# Altium footprint library 1.01-电阻.PcbLib: 82 footprints (part 2 of 6)
Each footprint in its own frame and in the unit in brackets; x right, y up, seen from the top. Pads: shape width x height; smd on the part's side, far side on the other; paste and mask are expansions set on the pad; w line width, h text height; cw(c..) or ccw(c..) is an arc to the next point about the centre after c.
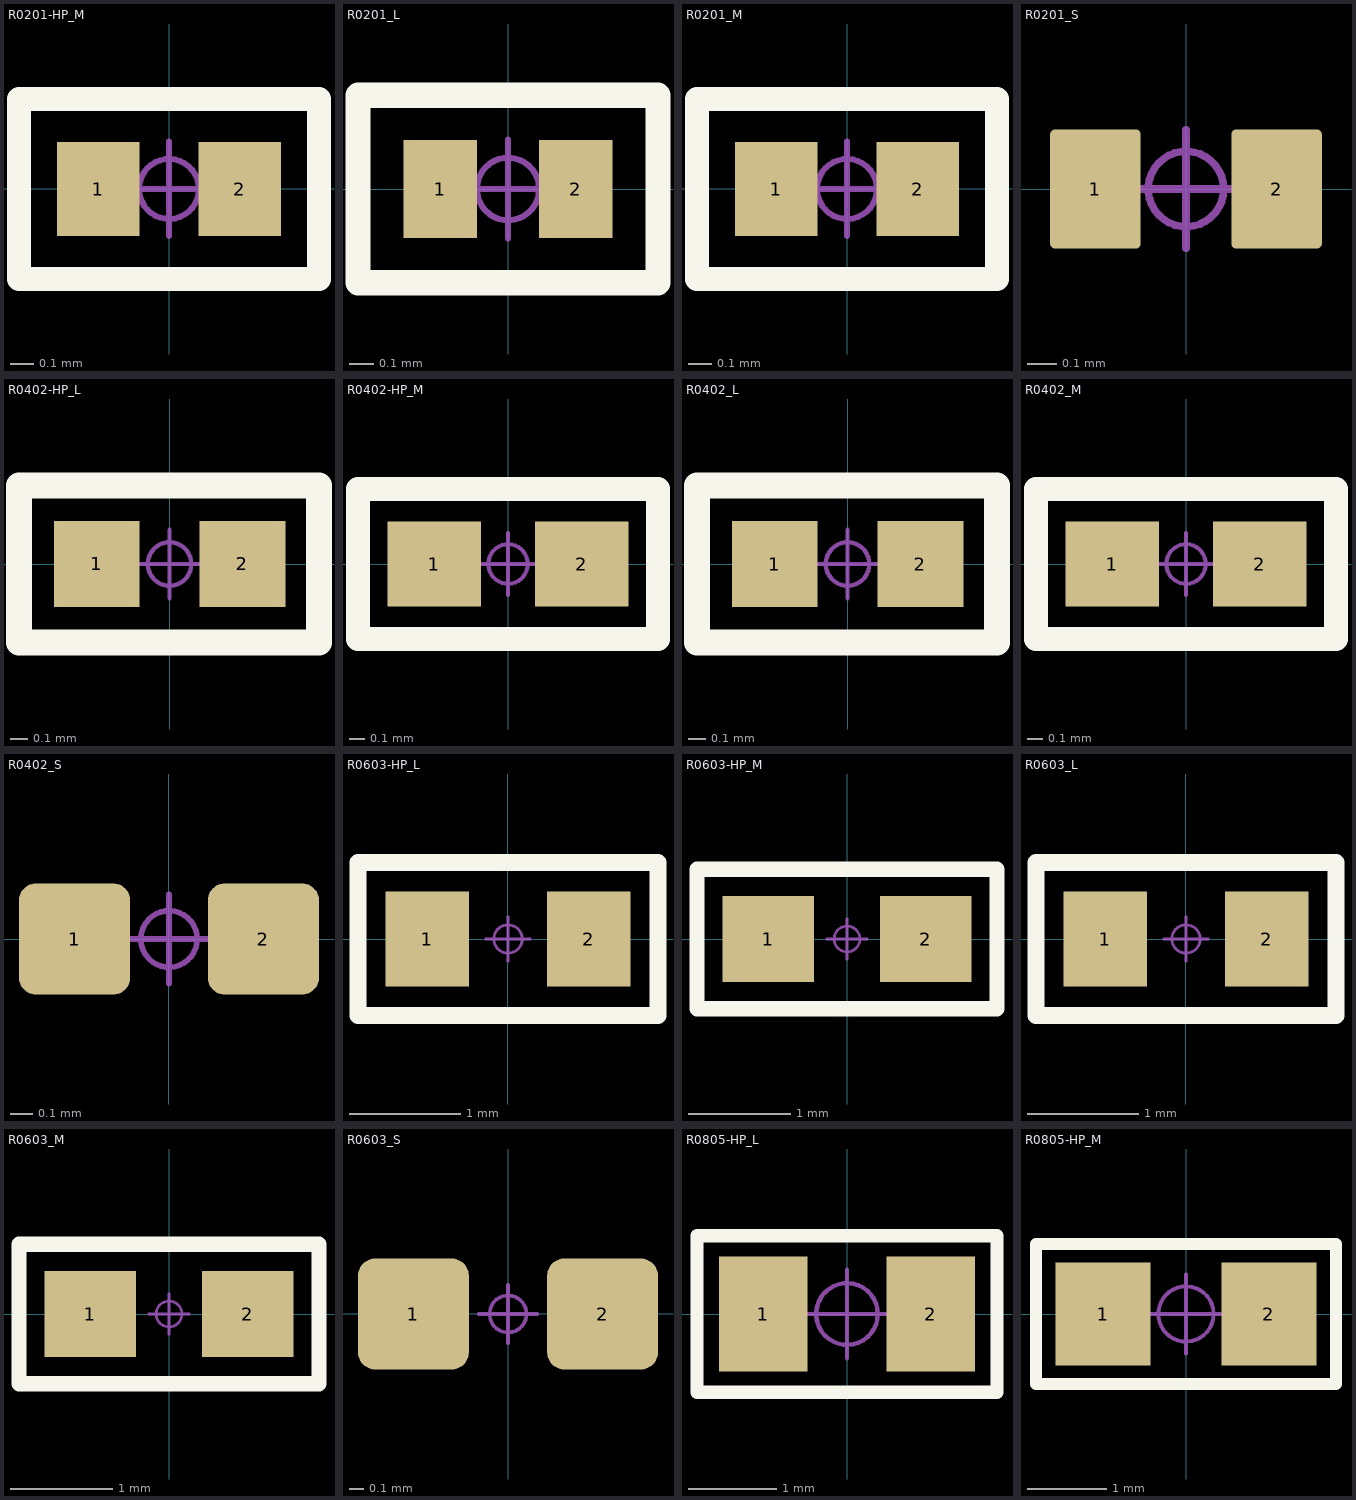
[diagram p1: the footprints below, top view; thin cyan lines are the x and y axes]

## R0201-HP_M [mm] "1/20W高精度贴片电阻           联系卖家 免费查找封装"
pads (2):
  rect 0.35x0.4 smd: 1(-0.3,0) 2(0.3,0)
Top Overlay:
  lines w0.102: -0.635,-0.381 -0.635,0.381 0.635,0.381 0.635,-0.381 -0.635,-0.381
Mechanical 15:
  circle w0.025: c0,0 r0.127
  lines w0.025: -0.2,0 0.2,0 ; 0,-0.2 0,0.2
3D body: height 0.23, standoff 0, extent -0.3,-0.15 0.3,0.15

## R0201_L [mm] "1/20W贴片电阻"
pads (2):
  rect 0.3x0.4 smd: 1(-0.275,0) 2(0.275,0)
Top Overlay:
  lines w0.102: -0.61,-0.381 -0.61,0.381 0.61,0.381 0.61,-0.381 -0.61,-0.381
Mechanical 15:
  circle w0.025: c0,0 r0.127
  lines w0.025: -0.2,0 0.2,0 ; 0,-0.2 0,0.2
3D body: height 0.23, standoff 0, extent -0.3,-0.15 0.3,0.15

## R0201_M [mm] "1/20W贴片电阻"
pads (2):
  rect 0.35x0.4 smd: 1(-0.3,0) 2(0.3,0)
Top Overlay:
  lines w0.102: 0.178,-0.381 0.61,-0.381 ; -0.635,-0.381 0.635,-0.381 0.635,0.381 -0.635,0.381 -0.635,-0.381
Mechanical 15:
  circle w0.025: c0,0 r0.127
  lines w0.025: -0.2,0 0.2,0 ; 0,-0.2 0,0.2
3D body: height 0.23, standoff 0, extent -0.3,-0.15 0.3,0.15

## R0201_S [mil] "1/20W贴片电阻-无丝印"
height 68.9
pads (2):
  rrect10% 12x15.75 smd mask+2: 1(-12,0) 2(12,0)
Mechanical 15:
  circle w1: c0,0 r5
  lines w1: -7.87,0 7.87,0 ; 0,-7.87 0,7.87
3D body: height 9.06, standoff 0, extent -11.81,-5.9 11.81,5.91

## R0402-HP_L [mm] "1/16W高精度贴片电阻"
pads (2):
  rect 0.5x0.5 smd: 1(-0.425,0) 2(0.425,0)
Top Overlay:
  lines w0.152: -0.878,-0.457 -0.878,0.457 0.872,0.457 0.872,-0.457 -0.878,-0.457
Mechanical 15:
  circle w0.025: c0,0 r0.127
  lines w0.025: -0.2,0 0.2,0 ; 0,-0.2 0,0.2
3D body: height 0.3, standoff 0, extent -0.5,-0.25 0.5,0.25

## R0402-HP_M [mm] "1/16W高精度贴片电阻"
pads (2):
  rect 0.6x0.55 smd: 1(-0.475,0) 2(0.475,0)
Top Overlay:
  lines w0.152: -0.965,-0.483 -0.965,0.483 0.965,0.483 0.965,-0.483 -0.965,-0.483
Mechanical 15:
  circle w0.025: c0,0 r0.127
  lines w0.025: -0.2,0 0.2,0 ; 0,-0.2 0,0.2
3D body: height 0.3, standoff 0, extent -0.5,-0.25 0.5,0.25

## R0402_L [mm] "1/16W贴片电阻"
pads (2):
  rect 0.5x0.5 smd: 1(-0.425,0) 2(0.425,0)
Top Overlay:
  lines w0.152: -0.878,-0.457 0.872,-0.457 0.872,0.457 -0.878,0.457 -0.878,-0.457
Mechanical 15:
  circle w0.025: c0,0 r0.127
  lines w0.025: -0.2,0 0.2,0 ; 0,-0.2 0,0.2
3D body: height 0.3, standoff 0, extent -0.5,-0.25 0.5,0.25

## R0402_M [mm] "1/16W贴片电阻"
pads (2):
  rect 0.6x0.55 smd: 1(-0.475,0) 2(0.475,0)
Top Overlay:
  lines w0.152: -0.965,-0.483 0.965,-0.483 0.965,0.483 -0.965,0.483 -0.965,-0.483
Mechanical 15:
  circle w0.025: c0,0 r0.127
  lines w0.025: -0.2,0 0.2,0 ; 0,-0.2 0,0.2
3D body: height 0.3, standoff 0, extent -0.5,-0.25 0.5,0.25

## R0402_S [mm] "1/16W贴片电阻-无丝印"
height 1.75
pads (2):
  rrect30% 0.5x0.5 smd mask+0.051: 1(-0.425,0) 2(0.425,0)
Mechanical 15:
  circle w0.025: c0,0 r0.127
  lines w0.025: -0.2,0 0.2,0 ; 0,-0.2 0,0.2
3D body: height 0.3, standoff 0, extent -0.5,-0.25 0.5,0.25

## R0603-HP_L [mm] "1/10W高精度贴片电阻"
pads (2):
  rect 0.75x0.85 smd: 1(-0.725,0) 2(0.725,0)
Top Overlay:
  lines w0.152: -1.346,-0.686 1.346,-0.686 1.346,0.686 -1.346,0.686 -1.346,-0.686
Mechanical 15:
  circle w0.025: c0,0 r0.127
  lines w0.025: -0.2,0 0.2,0 ; 0,-0.2 0,0.2
3D body: height 0.4, standoff -0.01, extent -0.8,-0.4 0.8,0.4

## R0603-HP_M [mm] "1/10W高精度贴片电阻"
pads (2):
  rect 0.9x0.85 smd: 1(-0.775,0) 2(0.775,0)
Top Overlay:
  lines w0.152: -1.475,-0.686 -1.475,0.686 1.475,0.686 1.475,-0.686 -1.475,-0.686
Mechanical 15:
  circle w0.025: c0,0 r0.127
  lines w0.025: -0.2,0 0.2,0 ; 0,-0.2 0,0.2
3D body: height 0.4, standoff -0.01, extent -0.8,-0.4 0.8,0.4

## R0603_L [mm] "1/10W贴片电阻"
pads (2):
  rect 0.75x0.85 smd: 1(-0.725,0) 2(0.725,0)
Top Overlay:
  lines w0.152: -1.346,-0.686 -1.346,0.686 1.346,0.686 1.346,-0.686 -1.346,-0.686
Mechanical 15:
  circle w0.025: c0,0 r0.127
  lines w0.025: -0.2,0 0.2,0 ; 0,-0.2 0,0.2
3D body: height 0.4, standoff 0, extent -0.8,-0.4 0.8,0.4

## R0603_M [mm] "1/10W贴片电阻"
pads (2):
  rect 0.9x0.85 smd: 1(-0.775,0) 2(0.775,0)
Top Overlay:
  lines w0.152: -1.475,-0.686 -1.475,0.686 1.475,0.686 1.475,-0.686 -1.475,-0.686
Mechanical 15:
  circle w0.025: c0,0 r0.127
  lines w0.025: -0.2,0 0.2,0 ; 0,-0.2 0,0.2
3D body: height 0.4, standoff 0, extent -0.8,-0.4 0.8,0.4

## R0603_S [mil] "1/10W贴片电阻-无丝印"
height 68.9
pads (2):
  rrect30% 30x30 smd: 1(-25.59,0) 2(25.59,0)
Mechanical 15:
  circle w1: c0,0 r5
  lines w1: -7.87,0 7.87,0 ; 0,-7.87 0,7.87
3D body: height 15.75, standoff -0.04, extent -31.5,-15.74 31.49,15.75

## R0805-HP_L [mm] "1/8W高精度贴片电阻"
pads (2):
  rect 1x1.3 smd: 1(-0.95,0) 2(0.95,0)
Top Overlay:
  lines w0.152: -1.702,-0.889 1.702,-0.889 1.702,0.889 -1.702,0.889 -1.702,-0.889
Mechanical 15:
  circle w0.05: c0,0 r0.35
  lines w0.05: -0.5,0 0.5,0 ; 0,-0.5 0,0.5
3D body: height 0.5, standoff 0, extent -1,-0.625 1,0.625

## R0805-HP_M [mm] "1/8W高精度贴片电阻"
pads (2):
  rect 1.2x1.3 smd: 1(-1.05,0) 2(1.05,0)
Top Overlay:
  lines w0.152: -1.9,-0.889 -1.9,0.889 1.9,0.889 1.9,-0.889 -1.9,-0.889
Mechanical 15:
  circle w0.05: c0,0 r0.35
  lines w0.05: -0.5,0 0.5,0 ; 0,-0.5 0,0.5
3D body: height 0.5, standoff 0, extent -1,-0.625 1,0.625